# Altium footprint library B-NT_CHIPS.PcbLib: 90 footprints (part 6 of 6)
Each footprint in its own frame and in the unit in brackets; x right, y up, seen from the top. Pads: shape width x height; smd on the part's side, far side on the other; paste and mask are expansions set on the pad; w line width, h text height; cw(c..) or ccw(c..) is an arc to the next point about the centre after c.
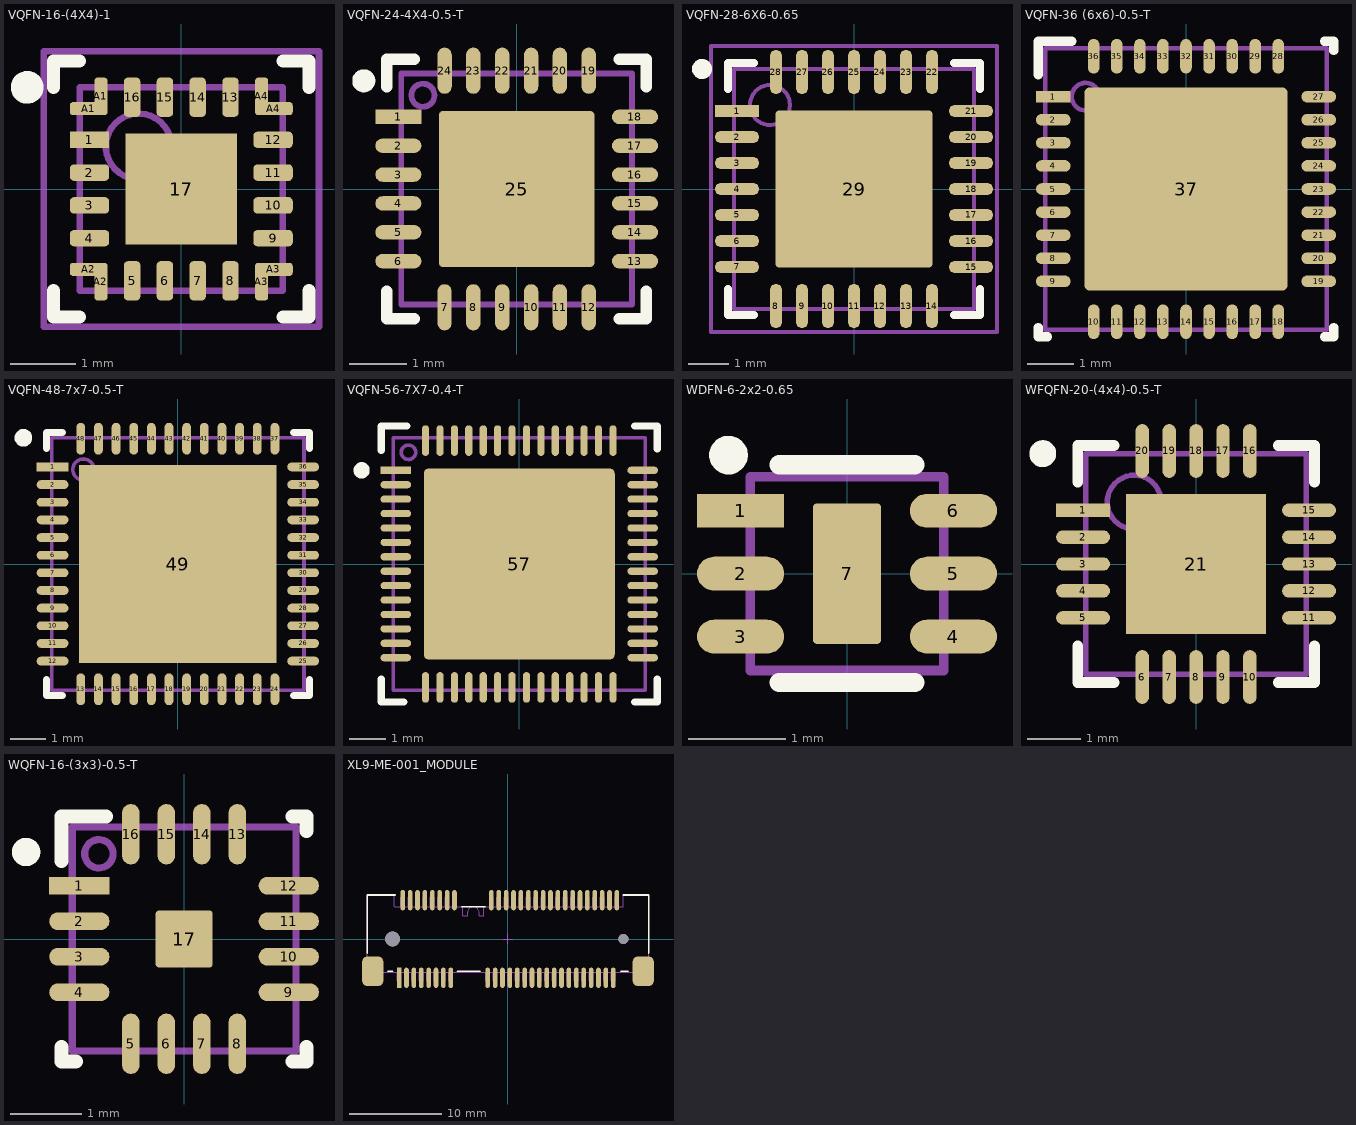
[diagram p5: the footprints below, top view; thin cyan lines are the x and y axes]

## VQFN-16-(4X4)-1 [mm] "Body 3.1x3.1x1mm(max)"
height 1
pads (25):
  rect 0.6x0.25 smd: 1(-1.4,0.75)
  rrect50% 0.6x0.25 smd: 2(-1.4,0.25) 3(-1.4,-0.25) 4(-1.4,-0.75) 9(1.4,-0.75) 10(1.4,-0.25) 11(1.4,0.25) 12(1.4,0.75)
  rrect50% 0.25x0.6 smd: 5(-0.75,-1.4) 6(-0.25,-1.4) 7(0.25,-1.4) 8(0.75,-1.4) 13(0.75,1.4) 14(0.25,1.4) 15(-0.25,1.4) 16(-0.75,1.4)
  rect 1.7x1.7 smd: 17(0,0)
  rrect50% 0.575x0.2 smd: А1(-1.412,1.225) А2(-1.413,-1.225) А3(1.412,-1.225) А4(1.412,1.225)
  rrect50% 0.2x0.575 smd: А1(-1.225,1.412) А2(-1.225,-1.412) А3(1.225,-1.412) А4(1.225,1.412)
Top Overlay:
  circle w0.25: c-2.35,1.55 r0.125
  lines w0.2: -1.95,-1.55 -1.95,-1.95 -1.55,-1.95 ; -1.95,1.55 -1.95,1.95 -1.55,1.95 ; 1.55,-1.95 1.95,-1.95 1.95,-1.55 ; 1.55,1.95 1.95,1.95 1.95,1.55
M3 Top Assy:
  circle w0.1: c-0.65,0.65 r0.5
  lines w0.1: -1.55,-1.55 1.55,-1.55 1.55,1.55 -1.55,1.55 -1.55,-1.55
M8 Top Brd Anno:
  lines w0.1: -0.5,0 0.5,0 ; 0,-0.5 0,0.5 ; -2.1,-2.1 2.1,-2.1 2.1,2.1 -2.1,2.1 -2.1,-2.1
3D body "VQFN-16 (4X4).step": height 1, standoff 0, extent -1.6,-1.6 1.6,1.6

## VQFN-24-4X4-0.5-T [mm] "QFN, 24-Leads with exposed die pad, Body 4.1x4.1mm (max), Pitch 0.50mm"
height 1
pads (25):
  rect 0.8x0.25 smd: 1(-2.05,1.25)
  oval 0.8x0.25 smd: 2(-2.05,0.75) 3(-2.05,0.25) 4(-2.05,-0.25) 5(-2.05,-0.75) 6(-2.05,-1.25) 13(2.05,-1.25) 14(2.05,-0.75) 15(2.05,-0.25) 16(2.05,0.25) 17(2.05,0.75) 18(2.05,1.25)
  oval 0.25x0.8 smd: 7(-1.25,-2.05) 8(-0.75,-2.05) 9(-0.25,-2.05) 10(0.25,-2.05) 11(0.75,-2.05) 12(1.25,-2.05) 19(1.25,2.05) 20(0.75,2.05) 21(0.25,2.05) 22(-0.25,2.05) 23(-0.75,2.05) 24(-1.25,2.05)
  rrect5% 2.7x2.7 smd: 25(0,0)
Top Overlay:
  circle w0.2: c-2.65,1.875 r0.1
  lines w0.2: -2.25,-1.775 -2.25,-2.25 -1.775,-2.25 ; -2.25,1.775 -2.25,2.25 -1.775,2.25 ; 1.775,-2.25 2.25,-2.25 2.25,-1.775 ; 1.775,2.25 2.25,2.25 2.25,1.775
M3 Top Assy:
  circle w0.1: c-1.625,1.625 r0.2
  lines w0.1: -2,-2 -2,2 2,2 2,-2 -2,-2
M8 Top Brd Anno:
  lines w0.1: -0.4,0 0.4,0 ; 0,-0.4 0,0.4
3D body "User Library-VQFN-24.STEP": height 1.05, standoff -0.02, extent -2.05,-2.05 2.05,2.05

## VQFN-28-6X6-0.65 [mm] "Body 6x6x1mm, pitch 0.65mm"
height 1
pads (29):
  rect 1.1x0.3 smd: 1(-2.925,1.95)
  oval 1.1x0.3 smd: 2(-2.925,1.3) 3(-2.925,0.65) 4(-2.925,0) 5(-2.925,-0.65) 6(-2.925,-1.3) 7(-2.925,-1.95) 15(2.925,-1.95) 16(2.925,-1.3) 17(2.925,-0.65) 18(2.925,0) 19(2.925,0.65) 20(2.925,1.3) 21(2.925,1.95)
  oval 0.3x1.1 smd: 8(-1.95,-2.925) 9(-1.3,-2.925) 10(-0.65,-2.925) 11(0,-2.925) 12(0.65,-2.925) 13(1.3,-2.925) 14(1.95,-2.925) 22(1.95,2.925) 23(1.3,2.925) 24(0.65,2.925) 25(0,2.925) 26(-0.65,2.925) 27(-1.3,2.925) 28(-1.95,2.925)
  rrect5% 3.93x3.93 smd: 29(0,0)
Top Overlay:
  circle w0.25: c-3.8,3 r0.125
  lines w0.2: -3.15,-2.5 -3.15,-3.15 -2.5,-3.15 ; -3.15,2.5 -3.15,3.15 -2.5,3.15 ; 2.5,-3.15 3.15,-3.15 3.15,-2.5 ; 2.5,3.15 3.15,3.15 3.15,2.5
M3 Top Assy:
  circle w0.1: c-2.1,2.1 r0.5
  lines w0.1: -3,-3 -3,3 3,3 3,-3 -3,-3
M8 Top Brd Anno:
  lines w0.1: -0.5,0 0.5,0 ; 0,-0.5 0,0.5 ; -3.575,-3.575 3.575,-3.575 3.575,3.575 -3.575,3.575 -3.575,-3.575
3D body "VQFN-28-6X6-0.65.step": height 1, standoff 0, extent -3.05,-3.05 3.05,3.05

## VQFN-36 (6x6)-0.5-T [mm] "Body 6.1x6.1x1mm(max)"
height 0.8
pads (37):
  rect 0.75x0.25 smd: 1(-2.875,2)
  oval 0.75x0.25 smd: 2(-2.875,1.5) 3(-2.875,1) 4(-2.875,0.5) 5(-2.875,0) 6(-2.875,-0.5) 7(-2.875,-1) 8(-2.875,-1.5) 9(-2.875,-2) 19(2.875,-2) 20(2.875,-1.5) 21(2.875,-1) 22(2.875,-0.5) 23(2.875,0) 24(2.875,0.5) 25(2.875,1) 26(2.875,1.5) 27(2.875,2)
  oval 0.25x0.75 smd: 10(-2,-2.875) 11(-1.5,-2.875) 12(-1,-2.875) 13(-0.5,-2.875) 14(0,-2.875) 15(0.5,-2.875) 16(1,-2.875) 17(1.5,-2.875) 18(2,-2.875) 28(2,2.875) 29(1.5,2.875) 30(1,2.875) 31(0.5,2.875) 32(0,2.875) 33(-0.5,2.875) 34(-1,2.875) 35(-1.5,2.875) 36(-2,2.875)
  rrect5% 4.4x4.4 smd: 37(0,0)
Top Overlay:
  lines w0.2: -3.2,-3 -3.2,-3.2 -3,-3.2 ; -3.2,2.475 -3.2,3.2 -2.475,3.2 ; 3,-3.2 3.2,-3.2 3.2,-3 ; 3,3.2 3.2,3.2 3.2,3
M3 Top Assy:
  circle w0.1: c-2.175,2 r0.3
  lines w0.1: -3.05,-3.05 -3.05,3.05 3.05,3.05 3.05,-3.05 -3.05,-3.05
M8 Top Brd Anno:
  lines w0.1: -0.4,0 0.4,0 ; 0,-0.4 0,0.4
3D body "User Library-QFN36 (6x6).STEP": height 0.9, standoff 0.01, extent -3.102,-3.103 3.103,3.102

## VQFN-48-7x7-0.5-T [mm] "QFN, 48-Leads, Body 7,00x7,00mm, Pitch 0,50mm, Thermal Pad 5,60x5,60mm, IPC Medium Density"
height 1
pads (49):
  rect 0.9x0.25 smd: 1(-3.55,2.75)
  oval 0.9x0.25 smd: 2(-3.55,2.25) 3(-3.55,1.75) 4(-3.55,1.25) 5(-3.55,0.75) 6(-3.55,0.25) 7(-3.55,-0.25) 8(-3.55,-0.75) 9(-3.55,-1.25) 10(-3.55,-1.75) 11(-3.55,-2.25) 12(-3.55,-2.75) 25(3.55,-2.75) 26(3.55,-2.25) 27(3.55,-1.75) 28(3.55,-1.25) 29(3.55,-0.75) 30(3.55,-0.25) 31(3.55,0.25) 32(3.55,0.75) 33(3.55,1.25) 34(3.55,1.75) 35(3.55,2.25) 36(3.55,2.75)
  oval 0.25x0.9 smd: 13(-2.75,-3.55) 14(-2.25,-3.55) 15(-1.75,-3.55) 16(-1.25,-3.55) 17(-0.75,-3.55) 18(-0.25,-3.55) 19(0.25,-3.55) 20(0.75,-3.55) 21(1.25,-3.55) 22(1.75,-3.55) 23(2.25,-3.55) 24(2.75,-3.55) 37(2.75,3.55) 38(2.25,3.55) 39(1.75,3.55) 40(1.25,3.55) 41(0.75,3.55) 42(0.25,3.55) 43(-0.25,3.55) 44(-0.75,3.55) 45(-1.25,3.55) 46(-1.75,3.55) 47(-2.25,3.55) 48(-2.75,3.55)
  rect 5.6x5.6 smd: 49(0,0)
Top Overlay:
  circle w0.25: c-4.375,3.575 r0.125
  lines w0.2: -3.725,-3.275 -3.725,-3.725 -3.275,-3.725 ; -3.725,3.275 -3.725,3.725 -3.275,3.725 ; 3.275,-3.725 3.725,-3.725 3.725,-3.275 ; 3.275,3.725 3.725,3.725 3.725,3.275
M3 Top Assy:
  circle w0.1: c-2.675,2.675 r0.3
  lines w0.1: -3.575,-3.575 3.575,-3.575 3.575,3.575 -3.575,3.575 -3.575,-3.575
M8 Top Brd Anno:
  lines w0.1: -0.425,0 0.425,0 ; 0,-0.425 0,0.425
3D body "RGZ0048D.stp": height 1, standoff 0, extent -3.5,-3.5 3.5,3.5

## VQFN-56-7X7-0.4-T [mm] "QFN, 56-Leads, Body 7x7mm, Pitch 0.4mm, Thermal Pad 5.3x5.3mm"
height 1
pads (57):
  rect 0.85x0.2 smd: 1(-3.425,2.6)
  oval 0.85x0.2 smd: 2(-3.425,2.2) 3(-3.425,1.8) 4(-3.425,1.4) 5(-3.425,1) 6(-3.425,0.6) 7(-3.425,0.2) 8(-3.425,-0.2) 9(-3.425,-0.6) 10(-3.425,-1) 11(-3.425,-1.4) 12(-3.425,-1.8) 13(-3.425,-2.2) 14(-3.425,-2.6) 29(3.425,-2.6) 30(3.425,-2.2) 31(3.425,-1.8) 32(3.425,-1.4) 33(3.425,-1) 34(3.425,-0.6) 35(3.425,-0.2) 36(3.425,0.2) 37(3.425,0.6) 38(3.425,1) 39(3.425,1.4) 40(3.425,1.8) 41(3.425,2.2) 42(3.425,2.6)
  oval 0.2x0.85 smd: 15(-2.6,-3.425) 16(-2.2,-3.425) 17(-1.8,-3.425) 18(-1.4,-3.425) 19(-1,-3.425) 20(-0.6,-3.425) 21(-0.2,-3.425) 22(0.2,-3.425) 23(0.6,-3.425) 24(1,-3.425) 25(1.4,-3.425) 26(1.8,-3.425) 27(2.2,-3.425) 28(2.6,-3.425) 43(2.6,3.425) 44(2.2,3.425) 45(1.8,3.425) 46(1.4,3.425) 47(1,3.425) 48(0.6,3.425) 49(0.2,3.425) 50(-0.2,3.425) 51(-0.6,3.425) 52(-1,3.425) 53(-1.4,3.425) 54(-1.8,3.425) 55(-2.2,3.425) 56(-2.6,3.425)
  rrect5% 5.3x5.3 smd: 57(0,0)
Top Overlay:
  circle w0.25: c-4.375,2.6 r0.1
  lines w0.2: -3.829,-3.2 -3.829,-3.829 -3.2,-3.829 ; -3.829,3.15 -3.829,3.829 -3.125,3.829 ; 3.2,-3.829 3.829,-3.829 3.829,-3.2 ; 3.2,3.829 3.829,3.829 3.829,3.2
M3 Top Assy:
  circle w0.1: c-3.075,3.1 r0.2
  lines w0.1: -3.5,-3.5 -3.5,3.5 3.5,3.5 3.5,-3.5 -3.5,-3.5
M8 Top Brd Anno:
  lines w0.1: -0.3,0 0.3,0 ; 0,-0.3 0,0.3
3D body "RSH0056D.stp": height 0.96, standoff -0.04, extent -3.5,-3.5 3.5,3.5
3D body: height 0.25, standoff 0, extent 7.625,0.6 7.625,0.6

## WDFN-6-2x2-0.65 [mm]
height 0.8
pads (7):
  rect 0.9x0.35 smd: 1(-1.1,0.65)
  oval 0.9x0.35 smd: 2(-1.1,0) 3(-1.1,-0.65) 4(1.1,-0.65) 5(1.1,0) 6(1.1,0.65)
  rrect10% 0.7x1.45 smd: 7(0,0)
Top Overlay:
  circle w0.2: c-1.225,1.225 r0.1
  lines w0.2: -0.7,-1.125 0.7,-1.125 ; -0.7,1.125 0.7,1.125
M3 Top Assy:
  lines w0.1: -1,-1 1,-1 1,1 -1,1 -1,-1
M8 Top Brd Anno:
  lines w0.1: -0.3,0 0.3,0 ; 0,-0.3 0,0.3
3D body "User Library-DFN 6 2x2.STEP": height 0.75, standoff 0, extent -1.002,-1 1.002,1

## WFQFN-20-(4x4)-0.5-T [mm] "QFN, 20-Leads, Body 4,00x4,00mm, Pitch 0,50mm, Thermal Pad 2,6x2,6mm, IPC Medium Density"
height 0.8
pads (21):
  rect 1x0.25 smd: 1(-2.1,1)
  oval 1x0.25 smd: 2(-2.1,0.5) 3(-2.1,0) 4(-2.1,-0.5) 5(-2.1,-1) 11(2.1,-1) 12(2.1,-0.5) 13(2.1,0) 14(2.1,0.5) 15(2.1,1)
  oval 0.25x1 smd: 6(-1,-2.1) 7(-0.5,-2.1) 8(0,-2.1) 9(0.5,-2.1) 10(1,-2.1) 16(1,2.1) 17(0.5,2.1) 18(0,2.1) 19(-0.5,2.1) 20(-1,2.1)
  rect 2.6x2.6 smd: 21(0,0)
Top Overlay:
  circle w0.25: c-2.85,2.05 r0.125
  lines w0.2: -2.2,-1.525 -2.2,-2.2 -1.525,-2.2 ; -2.2,1.525 -2.2,2.2 -1.525,2.2 ; 1.525,-2.2 2.2,-2.2 2.2,-1.525 ; 1.525,2.2 2.2,2.2 2.2,1.525
M3 Top Assy:
  circle w0.1: c-1.15,1.15 r0.5
  lines w0.1: -2.05,-2.05 2.05,-2.05 2.05,2.05 -2.05,2.05 -2.05,-2.05
M8 Top Brd Anno:
  lines w0.1: -0.5,0 0.5,0 ; 0,-0.5 0,0.5 ; -2.05,-2.05 2.05,-2.05 2.05,2.05 -2.05,2.05 -2.05,-2.05
3D body "wqfn-20_4x4x08.step": height 0.78, standoff -0.02, extent -2.01,-2.01 2.01,2.01

## WQFN-16-(3x3)-0.5-T [mm] "Body 3.15x3.15x0.8mm(max)"
height 0.8
pads (17):
  rect 0.85x0.25 smd: 1(-1.475,0.75)
  oval 0.85x0.25 smd: 2(-1.475,0.25) 3(-1.475,-0.25) 4(-1.475,-0.75) 9(1.475,-0.75) 10(1.475,-0.25) 11(1.475,0.25) 12(1.475,0.75)
  oval 0.25x0.85 smd: 5(-0.75,-1.475) 6(-0.25,-1.475) 7(0.25,-1.475) 8(0.75,-1.475) 13(0.75,1.475) 14(0.25,1.475) 15(-0.25,1.475) 16(-0.75,1.475)
  rrect10% 0.8x0.8 smd: 17(0,0)
Top Overlay:
  circle w0.2: c-2.225,1.225 r0.1
  lines w0.2: -1.725,-1.525 -1.725,-1.725 -1.525,-1.725 ; -1.725,1.1 -1.725,1.725 -1.1,1.725 ; 1.525,-1.725 1.725,-1.725 1.725,-1.525 ; 1.525,1.725 1.725,1.725 1.725,1.525
M3 Top Assy:
  circle w0.1: c-1.2,1.2 r0.2
  lines w0.1: -1.575,-1.575 1.575,-1.575 1.575,1.575 -1.575,1.575 -1.575,-1.575
M8 Top Brd Anno:
  lines w0.1: -0.3,0 0.3,0 ; 0,-0.3 0,0.3
3D body "RTE0016D.stp": height 0.8, standoff 0, extent -1.5,-1.5 1.5,1.5
3D body: height 0.25, standoff 0, extent -1.625,1.1 -1.625,1.1
3D body "RGT0016A.stp": height 1, standoff 0, extent -1.5,-1.5 1.5,1.5

## XL9-ME-001_MODULE [mm]
pads (56):
  rect 0.5x2.2 smd: 1(-11.8,-4.2)
  oval 0.5x2.2 smd: 2(-11.4,4.2) 3(-11,-4.2) 4(-10.6,4.2) 5(-10.2,-4.2) 6(-9.8,4.2) 7(-9.4,-4.2) 8(-9,4.2) 9(-8.6,-4.2) 10(-8.2,4.2) 11(-7.8,-4.2) 12(-7.4,4.2) 13(-7,-4.2) 14(-6.6,4.2) 15(-6.2,-4.2) 16(-5.8,4.2) 17(-2.2,-4.2) 18(-1.8,4.2) 19(-1.4,-4.2) 20(-1,4.2) 21(-0.6,-4.2) 22(-0.2,4.2) 23(0.2,-4.2) 24(0.6,4.2) 25(1,-4.2) 26(1.4,4.2) 27(1.8,-4.2) 28(2.2,4.2) 29(2.6,-4.2) 30(3,4.2) 31(3.4,-4.2) 32(3.8,4.2) 33(4.2,-4.2) 34(4.6,4.2) 35(5,-4.2) 36(5.4,4.2) 37(5.8,-4.2) 38(6.2,4.2) 39(6.6,-4.2) 40(7,4.2) 41(7.4,-4.2) 42(7.8,4.2) 43(8.2,-4.2) 44(8.6,4.2) 45(9,-4.2) 46(9.4,4.2) 47(9.8,-4.2) 48(10.2,4.2) 49(10.6,-4.2) 50(11,4.2) 51(11.4,-4.2) 52(11.8,4.2)
  rrect50% 2.3x3.2 smd: ""(-14.65,-3.5) ""(14.65,-3.5)
  round 1.6 hole 1.6: ""(-12.5,0)
  round 1.1 hole 1.1: ""(12.5,0)
Top Overlay:
  lines w0.2: -15.25,-1.5 -15.25,4.75 -12.25,4.75 ; -13,-3.5 -12.5,-3.5 ; -5.5,-3.5 -3,-3.5 ; -5,3.5 -2.5,3.5 ; 12.25,-3.5 13,-3.5 ; 12.5,4.75 15.25,4.75 15.25,-1.5
M3 Top Assy:
  drawing of 236 lines, arcs and shapes, not listed
M8 Top Brd Anno:
  lines w0.1: -0.5,0 0.5,0 ; 0,-0.5 0,0.5
3D body "digi.STEP": height 7.09, standoff -0.65, extent -17,-4.6 17,50.93